# Altium schematic symbol library jlcpcb_2025_04_capacitors_extended_0603.schlib: 3668 symbols (part 4 of 20) (continued)
## 0603N150G101CT
designator C?  Capacitance: 15pF  (hidden comment: *)
Capacitor, Ceramic (MLCC), 15pF, ±2%, 100V, NP0, ±2%, SMD 0603; Manufacturer: Walsin Tech Corp; Manufacturer Part Number: 0603N150G101CT; Package Size: 0603; JLCPCB Basic Part: No; JLCPCB Part Number: C302055; Supplier 1: LCSC; Category: Capacitors - MLCC; Supplier Part Number 1: C302055; Tolerance: ±2%; Voltage Rating: 100V; Temperature Coefficient: NP0; RoHS: Yes; ComponentLink1Description: Datasheet; ComponentLink1URL: https://wmsc.lcsc.com/wmsc/upload/file/pdf/v2/lcsc/2304140030_Walsin-Tech-Corp-0603N150G101CT_C302055.pdf; ComponentLink2Description: JLCPCB Part URL; ComponentLink2URL: https://jlcpcb.com/partdetail/C302055; ComponentLink3Description: LCSC Part URL; ComponentLink3URL: https://lcsc.com/product-detail/Multilayer-Ceramic-Capacitors-MLCC---SMD-SMT_Walsin-Tech-Corp-Walsin-Tech-Corp-0603N150G101CT_C302055.html
footprint CAP-0603 (0603 (1608M) Capacitor)
pins: 1, 2

## 0603N150G500CT
designator C?  Capacitance: 15pF  (hidden comment: *)
Capacitor, Ceramic (MLCC), 15pF, ±2%, 50V, NP0, ±2%, SMD 0603; Manufacturer: Walsin Tech Corp; Manufacturer Part Number: 0603N150G500CT; Package Size: 0603; JLCPCB Basic Part: No; JLCPCB Part Number: C388032; Supplier 1: LCSC; Category: Capacitors - MLCC; Supplier Part Number 1: C388032; Tolerance: ±2%; Voltage Rating: 50V; Temperature Coefficient: NP0; RoHS: Yes; ComponentLink1Description: Datasheet; ComponentLink1URL: https://wmsc.lcsc.com/wmsc/upload/file/pdf/v2/lcsc/2304140030_Walsin-Tech-Corp-0603N150G500CT_C388032.pdf; ComponentLink2Description: JLCPCB Part URL; ComponentLink2URL: https://jlcpcb.com/partdetail/C388032; ComponentLink3Description: LCSC Part URL; ComponentLink3URL: https://lcsc.com/product-detail/Multilayer-Ceramic-Capacitors-MLCC---SMD-SMT_Walsin-Tech-Corp-Walsin-Tech-Corp-0603N150G500CT_C388032.html
footprint CAP-0603 (0603 (1608M) Capacitor)
pins: 1, 2

## 0603N150J500CT
designator C?  Capacitance: 15pF  (hidden comment: *)
Capacitor, Ceramic (MLCC), 15pF, ±5%, 50V, NP0, ±5%, SMD 0603; Manufacturer: Walsin Tech Corp; Manufacturer Part Number: 0603N150J500CT; Package Size: 0603; JLCPCB Basic Part: No; JLCPCB Part Number: C302056; Supplier 1: LCSC; Category: Capacitors - MLCC; Supplier Part Number 1: C302056; Tolerance: ±5%; Voltage Rating: 50V; Temperature Coefficient: NP0; RoHS: Yes; ComponentLink1Description: Datasheet; ComponentLink1URL: https://wmsc.lcsc.com/wmsc/upload/file/pdf/v2/lcsc/2304140030_Walsin-Tech-Corp-0603N150J500CT_C302056.pdf; ComponentLink2Description: JLCPCB Part URL; ComponentLink2URL: https://jlcpcb.com/partdetail/C302056; ComponentLink3Description: LCSC Part URL; ComponentLink3URL: https://lcsc.com/product-detail/Multilayer-Ceramic-Capacitors-MLCC---SMD-SMT_Walsin-Tech-Corp-Walsin-Tech-Corp-0603N150J500CT_C302056.html
footprint CAP-0603 (0603 (1608M) Capacitor)
pins: 1, 2

## 0603N150K500CT
designator C?  Capacitance: 15pF  (hidden comment: *)
Capacitor, Ceramic (MLCC), 15pF, ±10%, 50V, NP0, ±10%, SMD 0603; Manufacturer: Walsin Tech Corp; Manufacturer Part Number: 0603N150K500CT; Package Size: 0603; JLCPCB Basic Part: No; JLCPCB Part Number: C384776; Supplier 1: LCSC; Category: Capacitors - MLCC; Supplier Part Number 1: C384776; Tolerance: ±10%; Voltage Rating: 50V; Temperature Coefficient: NP0; RoHS: Yes; ComponentLink1Description: Datasheet; ComponentLink1URL: https://wmsc.lcsc.com/wmsc/upload/file/pdf/v2/lcsc/2304140030_Walsin-Tech-Corp-0603N150K500CT_C384776.pdf; ComponentLink2Description: JLCPCB Part URL; ComponentLink2URL: https://jlcpcb.com/partdetail/C384776; ComponentLink3Description: LCSC Part URL; ComponentLink3URL: https://lcsc.com/product-detail/Multilayer-Ceramic-Capacitors-MLCC---SMD-SMT_Walsin-Tech-Corp-Walsin-Tech-Corp-0603N150K500CT_C384776.html
footprint CAP-0603 (0603 (1608M) Capacitor)
pins: 1, 2

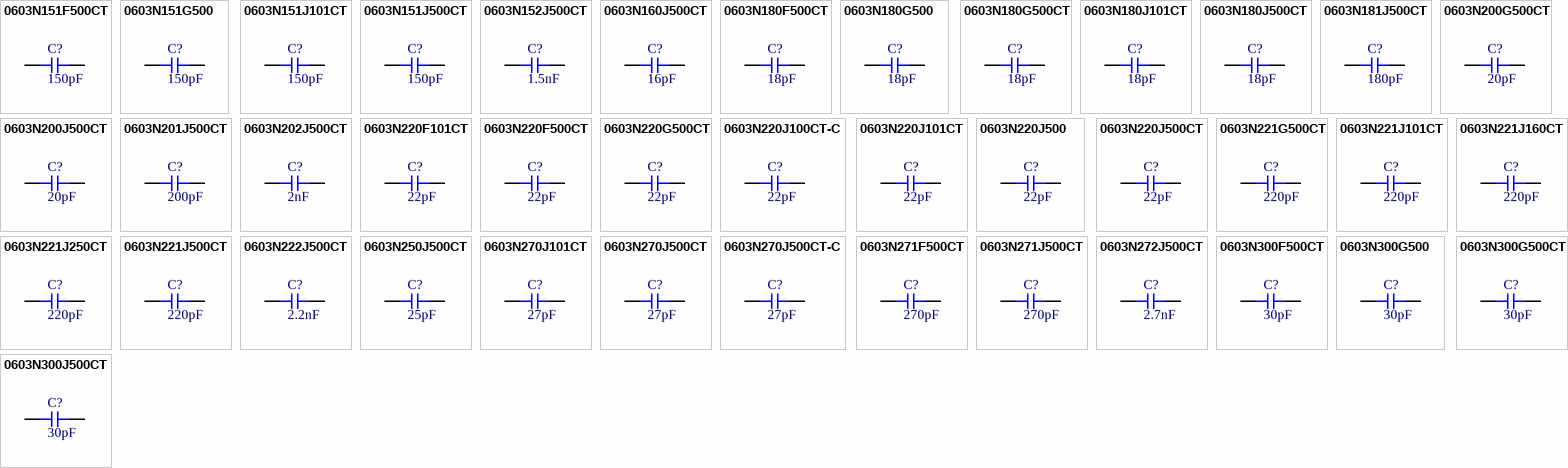
[diagram p17: symbols 0603N151F500CT to 0603N300J500CT]

## 0603N151F500CT
designator C?  Capacitance: 150pF  (hidden comment: *)
Capacitor, Ceramic (MLCC), 150pF, ±1%, 50V, NP0, ±1%, SMD 0603; Manufacturer: Walsin Tech Corp; Manufacturer Part Number: 0603N151F500CT; Package Size: 0603; JLCPCB Basic Part: No; JLCPCB Part Number: C458894; Supplier 1: LCSC; Category: Capacitors - MLCC; Supplier Part Number 1: C458894; Tolerance: ±1%; Voltage Rating: 50V; Temperature Coefficient: NP0; RoHS: Yes; ComponentLink1Description: Datasheet; ComponentLink1URL: https://wmsc.lcsc.com/wmsc/upload/file/pdf/v2/lcsc/2304140030_Walsin-Tech-Corp-0603N151F500CT_C458894.pdf; ComponentLink2Description: JLCPCB Part URL; ComponentLink2URL: https://jlcpcb.com/partdetail/C458894; ComponentLink3Description: LCSC Part URL; ComponentLink3URL: https://lcsc.com/product-detail/Multilayer-Ceramic-Capacitors-MLCC---SMD-SMT_Walsin-Tech-Corp-Walsin-Tech-Corp-0603N151F500CT_C458894.html
footprint CAP-0603 (0603 (1608M) Capacitor)
pins: 1, 2

## 0603N151G500
designator C?  Capacitance: 150pF  (hidden comment: *)
Capacitor, Ceramic (MLCC), 150pF, ±2%, 50V, NP0, ±2%, SMD 0603; Manufacturer: Walsin Tech Corp; Manufacturer Part Number: 0603N151G500; Package Size: 0603; JLCPCB Basic Part: No; JLCPCB Part Number: C152924; Supplier 1: LCSC; Category: Capacitors - MLCC; Supplier Part Number 1: C152924; Tolerance: ±2%; Voltage Rating: 50V; Temperature Coefficient: NP0; RoHS: Yes; ComponentLink1Description: Datasheet; ComponentLink1URL: https://wmsc.lcsc.com/wmsc/upload/file/pdf/v2/lcsc/2304140030_Walsin-Tech-Corp-0603N151G500_C152924.pdf; ComponentLink2Description: JLCPCB Part URL; ComponentLink2URL: https://jlcpcb.com/partdetail/C152924; ComponentLink3Description: LCSC Part URL; ComponentLink3URL: https://lcsc.com/product-detail/Multilayer-Ceramic-Capacitors-MLCC---SMD-SMT_Walsin-Tech-Corp-Walsin-Tech-Corp-0603N151G500_C152924.html
footprint CAP-0603 (0603 (1608M) Capacitor)
pins: 1, 2

## 0603N151J101CT
designator C?  Capacitance: 150pF  (hidden comment: *)
Capacitor, Ceramic (MLCC), 150pF, ±5%, 100V, NP0, ±5%, SMD 0603; Manufacturer: Walsin Tech Corp; Manufacturer Part Number: 0603N151J101CT; Package Size: 0603; JLCPCB Basic Part: No; JLCPCB Part Number: C388033; Supplier 1: LCSC; Category: Capacitors - MLCC; Supplier Part Number 1: C388033; Tolerance: ±5%; Voltage Rating: 100V; Temperature Coefficient: NP0; RoHS: Yes; ComponentLink1Description: Datasheet; ComponentLink1URL: https://wmsc.lcsc.com/wmsc/upload/file/pdf/v2/lcsc/2304140030_Walsin-Tech-Corp-0603N151J101CT_C388033.pdf; ComponentLink2Description: JLCPCB Part URL; ComponentLink2URL: https://jlcpcb.com/partdetail/C388033; ComponentLink3Description: LCSC Part URL; ComponentLink3URL: https://lcsc.com/product-detail/Multilayer-Ceramic-Capacitors-MLCC---SMD-SMT_Walsin-Tech-Corp-Walsin-Tech-Corp-0603N151J101CT_C388033.html
footprint CAP-0603 (0603 (1608M) Capacitor)
pins: 1, 2

## 0603N151J500CT
designator C?  Capacitance: 150pF  (hidden comment: *)
Capacitor, Ceramic (MLCC), 150pF, ±5%, 50V, NP0, ±5%, SMD 0603; Manufacturer: Walsin Tech Corp; Manufacturer Part Number: 0603N151J500CT; Package Size: 0603; JLCPCB Basic Part: No; JLCPCB Part Number: C168906; Supplier 1: LCSC; Category: Capacitors - MLCC; Supplier Part Number 1: C168906; Tolerance: ±5%; Voltage Rating: 50V; Temperature Coefficient: NP0; RoHS: Yes; ComponentLink1Description: Datasheet; ComponentLink1URL: https://wmsc.lcsc.com/wmsc/upload/file/pdf/v2/lcsc/2304140030_Walsin-Tech-Corp-0603N151J500CT_C168906.pdf; ComponentLink2Description: JLCPCB Part URL; ComponentLink2URL: https://jlcpcb.com/partdetail/C168906; ComponentLink3Description: LCSC Part URL; ComponentLink3URL: https://lcsc.com/product-detail/Multilayer-Ceramic-Capacitors-MLCC---SMD-SMT_Walsin-Tech-Corp-Walsin-Tech-Corp-0603N151J500CT_C168906.html
footprint CAP-0603 (0603 (1608M) Capacitor)
pins: 1, 2

## 0603N152J500CT
designator C?  Capacitance: 1.5nF  (hidden comment: *)
Capacitor, Ceramic (MLCC), 1.5nF, ±5%, 50V, NP0, ±5%, SMD 0603; Manufacturer: Walsin Tech Corp; Manufacturer Part Number: 0603N152J500CT; Package Size: 0603; JLCPCB Basic Part: No; JLCPCB Part Number: C424864; Supplier 1: LCSC; Category: Capacitors - MLCC; Supplier Part Number 1: C424864; Tolerance: ±5%; Voltage Rating: 50V; Temperature Coefficient: NP0; RoHS: Yes; ComponentLink1Description: Datasheet; ComponentLink1URL: https://wmsc.lcsc.com/wmsc/upload/file/pdf/v2/lcsc/2304140030_Walsin-Tech-Corp-0603N152J500CT_C424864.pdf; ComponentLink2Description: JLCPCB Part URL; ComponentLink2URL: https://jlcpcb.com/partdetail/C424864; ComponentLink3Description: LCSC Part URL; ComponentLink3URL: https://lcsc.com/product-detail/Multilayer-Ceramic-Capacitors-MLCC---SMD-SMT_Walsin-Tech-Corp-Walsin-Tech-Corp-0603N152J500CT_C424864.html
footprint CAP-0603 (0603 (1608M) Capacitor)
pins: 1, 2

## 0603N160J500CT
designator C?  Capacitance: 16pF  (hidden comment: *)
Capacitor, Ceramic (MLCC), 16pF, ±5%, 50V, NP0, ±5%, SMD 0603; Manufacturer: Walsin Tech Corp; Manufacturer Part Number: 0603N160J500CT; Package Size: 0603; JLCPCB Basic Part: No; JLCPCB Part Number: C152922; Supplier 1: LCSC; Category: Capacitors - MLCC; Supplier Part Number 1: C152922; Tolerance: ±5%; Voltage Rating: 50V; Temperature Coefficient: NP0; RoHS: Yes; ComponentLink1Description: Datasheet; ComponentLink1URL: https://wmsc.lcsc.com/wmsc/upload/file/pdf/v2/lcsc/2304140030_Walsin-Tech-Corp-0603N160J500CT_C152922.pdf; ComponentLink2Description: JLCPCB Part URL; ComponentLink2URL: https://jlcpcb.com/partdetail/C152922; ComponentLink3Description: LCSC Part URL; ComponentLink3URL: https://lcsc.com/product-detail/Multilayer-Ceramic-Capacitors-MLCC---SMD-SMT_Walsin-Tech-Corp-Walsin-Tech-Corp-0603N160J500CT_C152922.html
footprint CAP-0603 (0603 (1608M) Capacitor)
pins: 1, 2

## 0603N180F500CT
designator C?  Capacitance: 18pF  (hidden comment: *)
Capacitor, Ceramic (MLCC), 18pF, ±1%, 50V, NP0, ±1%, SMD 0603; Manufacturer: Walsin Tech Corp; Manufacturer Part Number: 0603N180F500CT; Package Size: 0603; JLCPCB Basic Part: No; JLCPCB Part Number: C509264; Supplier 1: LCSC; Category: Capacitors - MLCC; Supplier Part Number 1: C509264; Tolerance: ±1%; Voltage Rating: 50V; Temperature Coefficient: NP0; RoHS: Yes; ComponentLink1Description: Datasheet; ComponentLink1URL: https://wmsc.lcsc.com/wmsc/upload/file/pdf/v2/lcsc/2304140030_Walsin-Tech-Corp-0603N180F500CT_C509264.pdf; ComponentLink2Description: JLCPCB Part URL; ComponentLink2URL: https://jlcpcb.com/partdetail/C509264; ComponentLink3Description: LCSC Part URL; ComponentLink3URL: https://lcsc.com/product-detail/Multilayer-Ceramic-Capacitors-MLCC---SMD-SMT_Walsin-Tech-Corp-Walsin-Tech-Corp-0603N180F500CT_C509264.html
footprint CAP-0603 (0603 (1608M) Capacitor)
pins: 1, 2

## 0603N180G500
designator C?  Capacitance: 18pF  (hidden comment: *)
Capacitor, Ceramic (MLCC), 18pF, ±2%, 50V, NP0, ±2%, SMD 0603; Manufacturer: Walsin Tech Corp; Manufacturer Part Number: 0603N180G500; Package Size: 0603; JLCPCB Basic Part: No; JLCPCB Part Number: C152921; Supplier 1: LCSC; Category: Capacitors - MLCC; Supplier Part Number 1: C152921; Tolerance: ±2%; Voltage Rating: 50V; Temperature Coefficient: NP0; RoHS: Yes; ComponentLink1Description: Datasheet; ComponentLink1URL: https://wmsc.lcsc.com/wmsc/upload/file/pdf/v2/lcsc/2304140030_Walsin-Tech-Corp-0603N180G500_C152921.pdf; ComponentLink2Description: JLCPCB Part URL; ComponentLink2URL: https://jlcpcb.com/partdetail/C152921; ComponentLink3Description: LCSC Part URL; ComponentLink3URL: https://lcsc.com/product-detail/Multilayer-Ceramic-Capacitors-MLCC---SMD-SMT_Walsin-Tech-Corp-Walsin-Tech-Corp-0603N180G500_C152921.html
footprint CAP-0603 (0603 (1608M) Capacitor)
pins: 1, 2

## 0603N180G500CT
designator C?  Capacitance: 18pF  (hidden comment: *)
Capacitor, Ceramic (MLCC), 18pF, ±2%, 50V, NP0, ±2%, SMD 0603; Manufacturer: Walsin Tech Corp; Manufacturer Part Number: 0603N180G500CT; Package Size: 0603; JLCPCB Basic Part: No; JLCPCB Part Number: C2962049; Supplier 1: LCSC; Category: Capacitors - MLCC; Supplier Part Number 1: C2962049; Tolerance: ±2%; Voltage Rating: 50V; Temperature Coefficient: NP0; RoHS: Yes; ComponentLink1Description: Datasheet; ComponentLink1URL: https://wmsc.lcsc.com/wmsc/upload/file/pdf/v2/lcsc/2201181800_Walsin-Tech-Corp-0603N180G500CT_C2962049.pdf; ComponentLink2Description: JLCPCB Part URL; ComponentLink2URL: https://jlcpcb.com/partdetail/C2962049; ComponentLink3Description: LCSC Part URL; ComponentLink3URL: https://lcsc.com/product-detail/Multilayer-Ceramic-Capacitors-MLCC---SMD-SMT_Walsin-Tech-Corp-Walsin-Tech-Corp-0603N180G500CT_C2962049.html
footprint CAP-0603 (0603 (1608M) Capacitor)
pins: 1, 2

## 0603N180J101CT
designator C?  Capacitance: 18pF  (hidden comment: *)
Capacitor, Ceramic (MLCC), 18pF, ±5%, 100V, NP0, ±5%, SMD 0603; Manufacturer: Walsin Tech Corp; Manufacturer Part Number: 0603N180J101CT; Package Size: 0603; JLCPCB Basic Part: No; JLCPCB Part Number: C152920; Supplier 1: LCSC; Category: Capacitors - MLCC; Supplier Part Number 1: C152920; Tolerance: ±5%; Voltage Rating: 100V; Temperature Coefficient: NP0; RoHS: Yes; ComponentLink1Description: Datasheet; ComponentLink1URL: https://wmsc.lcsc.com/wmsc/upload/file/pdf/v2/lcsc/2304140030_Walsin-Tech-Corp-0603N180J101CT_C152920.pdf; ComponentLink2Description: JLCPCB Part URL; ComponentLink2URL: https://jlcpcb.com/partdetail/C152920; ComponentLink3Description: LCSC Part URL; ComponentLink3URL: https://lcsc.com/product-detail/Multilayer-Ceramic-Capacitors-MLCC---SMD-SMT_Walsin-Tech-Corp-Walsin-Tech-Corp-0603N180J101CT_C152920.html
footprint CAP-0603 (0603 (1608M) Capacitor)
pins: 1, 2

## 0603N180J500CT
designator C?  Capacitance: 18pF  (hidden comment: *)
Capacitor, Ceramic (MLCC), 18pF, ±5%, 50V, NP0, ±5%, SMD 0603; Manufacturer: Walsin Tech Corp; Manufacturer Part Number: 0603N180J500CT; Package Size: 0603; JLCPCB Basic Part: No; JLCPCB Part Number: C123538; Supplier 1: LCSC; Category: Capacitors - MLCC; Supplier Part Number 1: C123538; Tolerance: ±5%; Voltage Rating: 50V; Temperature Coefficient: NP0; RoHS: Yes; ComponentLink1Description: Datasheet; ComponentLink1URL: https://wmsc.lcsc.com/wmsc/upload/file/pdf/v2/lcsc/2304140030_Walsin-Tech-Corp-0603N180J500CT_C123538.pdf; ComponentLink2Description: JLCPCB Part URL; ComponentLink2URL: https://jlcpcb.com/partdetail/C123538; ComponentLink3Description: LCSC Part URL; ComponentLink3URL: https://lcsc.com/product-detail/Multilayer-Ceramic-Capacitors-MLCC---SMD-SMT_Walsin-Tech-Corp-Walsin-Tech-Corp-0603N180J500CT_C123538.html
footprint CAP-0603 (0603 (1608M) Capacitor)
pins: 1, 2

## 0603N181J500CT
designator C?  Capacitance: 180pF  (hidden comment: *)
Capacitor, Ceramic (MLCC), 180pF, ±5%, 50V, NP0, ±5%, SMD 0603; Manufacturer: Walsin Tech Corp; Manufacturer Part Number: 0603N181J500CT; Package Size: 0603; JLCPCB Basic Part: No; JLCPCB Part Number: C296050; Supplier 1: LCSC; Category: Capacitors - MLCC; Supplier Part Number 1: C296050; Tolerance: ±5%; Voltage Rating: 50V; Temperature Coefficient: NP0; RoHS: Yes; ComponentLink1Description: Datasheet; ComponentLink1URL: https://wmsc.lcsc.com/wmsc/upload/file/pdf/v2/lcsc/2304140030_Walsin-Tech-Corp-0603N181J500CT_C296050.pdf; ComponentLink2Description: JLCPCB Part URL; ComponentLink2URL: https://jlcpcb.com/partdetail/C296050; ComponentLink3Description: LCSC Part URL; ComponentLink3URL: https://lcsc.com/product-detail/Multilayer-Ceramic-Capacitors-MLCC---SMD-SMT_Walsin-Tech-Corp-Walsin-Tech-Corp-0603N181J500CT_C296050.html
footprint CAP-0603 (0603 (1608M) Capacitor)
pins: 1, 2

## 0603N200G500CT
designator C?  Capacitance: 20pF  (hidden comment: *)
Capacitor, Ceramic (MLCC), 20pF, ±2%, 50V, NP0, ±2%, SMD 0603; Manufacturer: Walsin Tech Corp; Manufacturer Part Number: 0603N200G500CT; Package Size: 0603; JLCPCB Basic Part: No; JLCPCB Part Number: C237187; Supplier 1: LCSC; Category: Capacitors - MLCC; Supplier Part Number 1: C237187; Tolerance: ±2%; Voltage Rating: 50V; Temperature Coefficient: NP0; RoHS: Yes; ComponentLink1Description: Datasheet; ComponentLink1URL: https://wmsc.lcsc.com/wmsc/upload/file/pdf/v2/lcsc/2304140030_Walsin-Tech-Corp-0603N200G500CT_C237187.pdf; ComponentLink2Description: JLCPCB Part URL; ComponentLink2URL: https://jlcpcb.com/partdetail/C237187; ComponentLink3Description: LCSC Part URL; ComponentLink3URL: https://lcsc.com/product-detail/Multilayer-Ceramic-Capacitors-MLCC---SMD-SMT_Walsin-Tech-Corp-Walsin-Tech-Corp-0603N200G500CT_C237187.html
footprint CAP-0603 (0603 (1608M) Capacitor)
pins: 1, 2

## 0603N200J500CT
designator C?  Capacitance: 20pF  (hidden comment: *)
Capacitor, Ceramic (MLCC), 20pF, ±5%, 50V, NP0, ±5%, SMD 0603; Manufacturer: Walsin Tech Corp; Manufacturer Part Number: 0603N200J500CT; Package Size: 0603; JLCPCB Basic Part: No; JLCPCB Part Number: C123543; Supplier 1: LCSC; Category: Capacitors - MLCC; Supplier Part Number 1: C123543; Tolerance: ±5%; Voltage Rating: 50V; Temperature Coefficient: NP0; RoHS: Yes; ComponentLink1Description: Datasheet; ComponentLink1URL: https://wmsc.lcsc.com/wmsc/upload/file/pdf/v2/lcsc/2304140030_Walsin-Tech-Corp-0603N200J500CT_C123543.pdf; ComponentLink2Description: JLCPCB Part URL; ComponentLink2URL: https://jlcpcb.com/partdetail/C123543; ComponentLink3Description: LCSC Part URL; ComponentLink3URL: https://lcsc.com/product-detail/Multilayer-Ceramic-Capacitors-MLCC---SMD-SMT_Walsin-Tech-Corp-Walsin-Tech-Corp-0603N200J500CT_C123543.html
footprint CAP-0603 (0603 (1608M) Capacitor)
pins: 1, 2

## 0603N201J500CT
designator C?  Capacitance: 200pF  (hidden comment: *)
Capacitor, Ceramic (MLCC), 200pF, ±5%, 50V, NP0, ±5%, SMD 0603; Manufacturer: Walsin Tech Corp; Manufacturer Part Number: 0603N201J500CT; Package Size: 0603; JLCPCB Basic Part: No; JLCPCB Part Number: C458897; Supplier 1: LCSC; Category: Capacitors - MLCC; Supplier Part Number 1: C458897; Tolerance: ±5%; Voltage Rating: 50V; Temperature Coefficient: NP0; RoHS: Yes; ComponentLink1Description: Datasheet; ComponentLink1URL: https://wmsc.lcsc.com/wmsc/upload/file/pdf/v2/lcsc/2304140030_Walsin-Tech-Corp-0603N201J500CT_C458897.pdf; ComponentLink2Description: JLCPCB Part URL; ComponentLink2URL: https://jlcpcb.com/partdetail/C458897; ComponentLink3Description: LCSC Part URL; ComponentLink3URL: https://lcsc.com/product-detail/Multilayer-Ceramic-Capacitors-MLCC---SMD-SMT_Walsin-Tech-Corp-Walsin-Tech-Corp-0603N201J500CT_C458897.html
footprint CAP-0603 (0603 (1608M) Capacitor)
pins: 1, 2

## 0603N202J500CT
designator C?  Capacitance: 2nF  (hidden comment: *)
Capacitor, Ceramic (MLCC), 2nF, ±5%, 50V, NP0, ±5%, SMD 0603; Manufacturer: Walsin Tech Corp; Manufacturer Part Number: 0603N202J500CT; Package Size: 0603; JLCPCB Basic Part: No; JLCPCB Part Number: C458898; Supplier 1: LCSC; Category: Capacitors - MLCC; Supplier Part Number 1: C458898; Tolerance: ±5%; Voltage Rating: 50V; Temperature Coefficient: NP0; RoHS: Yes; ComponentLink1Description: Datasheet; ComponentLink1URL: https://wmsc.lcsc.com/wmsc/upload/file/pdf/v2/lcsc/2304140030_Walsin-Tech-Corp-0603N202J500CT_C458898.pdf; ComponentLink2Description: JLCPCB Part URL; ComponentLink2URL: https://jlcpcb.com/partdetail/C458898; ComponentLink3Description: LCSC Part URL; ComponentLink3URL: https://lcsc.com/product-detail/Multilayer-Ceramic-Capacitors-MLCC---SMD-SMT_Walsin-Tech-Corp-Walsin-Tech-Corp-0603N202J500CT_C458898.html
footprint CAP-0603 (0603 (1608M) Capacitor)
pins: 1, 2

## 0603N220F101CT
designator C?  Capacitance: 22pF  (hidden comment: *)
Capacitor, Ceramic (MLCC), 22pF, ±1%, 100V, NP0, ±1%, SMD 0603; Manufacturer: Walsin Tech Corp; Manufacturer Part Number: 0603N220F101CT; Package Size: 0603; JLCPCB Basic Part: No; JLCPCB Part Number: C296053; Supplier 1: LCSC; Category: Capacitors - MLCC; Supplier Part Number 1: C296053; Tolerance: ±1%; Voltage Rating: 100V; Temperature Coefficient: NP0; RoHS: Yes; ComponentLink1Description: Datasheet; ComponentLink1URL: https://wmsc.lcsc.com/wmsc/upload/file/pdf/v2/lcsc/2304140030_Walsin-Tech-Corp-0603N220F101CT_C296053.pdf; ComponentLink2Description: JLCPCB Part URL; ComponentLink2URL: https://jlcpcb.com/partdetail/C296053; ComponentLink3Description: LCSC Part URL; ComponentLink3URL: https://lcsc.com/product-detail/Multilayer-Ceramic-Capacitors-MLCC---SMD-SMT_Walsin-Tech-Corp-Walsin-Tech-Corp-0603N220F101CT_C296053.html
footprint CAP-0603 (0603 (1608M) Capacitor)
pins: 1, 2

## 0603N220F500CT
designator C?  Capacitance: 22pF  (hidden comment: *)
Capacitor, Ceramic (MLCC), 22pF, ±1%, 50V, NP0, ±1%, SMD 0603; Manufacturer: Walsin Tech Corp; Manufacturer Part Number: 0603N220F500CT; Package Size: 0603; JLCPCB Basic Part: No; JLCPCB Part Number: C388038; Supplier 1: LCSC; Category: Capacitors - MLCC; Supplier Part Number 1: C388038; Tolerance: ±1%; Voltage Rating: 50V; Temperature Coefficient: NP0; RoHS: Yes; ComponentLink1Description: Datasheet; ComponentLink1URL: https://wmsc.lcsc.com/wmsc/upload/file/pdf/v2/lcsc/2304140030_Walsin-Tech-Corp-0603N220F500CT_C388038.pdf; ComponentLink2Description: JLCPCB Part URL; ComponentLink2URL: https://jlcpcb.com/partdetail/C388038; ComponentLink3Description: LCSC Part URL; ComponentLink3URL: https://lcsc.com/product-detail/Multilayer-Ceramic-Capacitors-MLCC---SMD-SMT_Walsin-Tech-Corp-Walsin-Tech-Corp-0603N220F500CT_C388038.html
footprint CAP-0603 (0603 (1608M) Capacitor)
pins: 1, 2

## 0603N220G500CT
designator C?  Capacitance: 22pF  (hidden comment: *)
Capacitor, Ceramic (MLCC), 22pF, ±2%, 50V, NP0, ±2%, SMD 0603; Manufacturer: Walsin Tech Corp; Manufacturer Part Number: 0603N220G500CT; Package Size: 0603; JLCPCB Basic Part: No; JLCPCB Part Number: C388039; Supplier 1: LCSC; Category: Capacitors - MLCC; Supplier Part Number 1: C388039; Tolerance: ±2%; Voltage Rating: 50V; Temperature Coefficient: NP0; RoHS: Yes; ComponentLink1Description: Datasheet; ComponentLink1URL: https://wmsc.lcsc.com/wmsc/upload/file/pdf/v2/lcsc/2304140030_Walsin-Tech-Corp-0603N220G500CT_C388039.pdf; ComponentLink2Description: JLCPCB Part URL; ComponentLink2URL: https://jlcpcb.com/partdetail/C388039; ComponentLink3Description: LCSC Part URL; ComponentLink3URL: https://lcsc.com/product-detail/Multilayer-Ceramic-Capacitors-MLCC---SMD-SMT_Walsin-Tech-Corp-Walsin-Tech-Corp-0603N220G500CT_C388039.html
footprint CAP-0603 (0603 (1608M) Capacitor)
pins: 1, 2

## 0603N220J100CT-C
designator C?  Capacitance: 22pF  (hidden comment: *)
Capacitor, Ceramic (MLCC), 22pF, ±5%, 10V, NP0, ±5%, SMD 0603; Manufacturer: Walsin Tech Corp; Manufacturer Part Number: 0603N220J100CT-C; Package Size: 0603; JLCPCB Basic Part: No; JLCPCB Part Number: C2991405; Supplier 1: LCSC; Category: Capacitors - MLCC; Supplier Part Number 1: C2991405; Tolerance: ±5%; Voltage Rating: 10V; Temperature Coefficient: NP0; RoHS: Yes; ComponentLink1Description: Datasheet; ComponentLink1URL: https://wmsc.lcsc.com/wmsc/upload/file/pdf/v2/lcsc/2204131745_Walsin-Tech-Corp-0603N220J100CT-C_C2991405.pdf; ComponentLink2Description: JLCPCB Part URL; ComponentLink2URL: https://jlcpcb.com/partdetail/C2991405; ComponentLink3Description: LCSC Part URL; ComponentLink3URL: https://lcsc.com/product-detail/Multilayer-Ceramic-Capacitors-MLCC---SMD-SMT_Walsin-Tech-Corp-Walsin-Tech-Corp-0603N220J100CT-C_C2991405.html
footprint CAP-0603 (0603 (1608M) Capacitor)
pins: 1, 2

## 0603N220J101CT
designator C?  Capacitance: 22pF  (hidden comment: *)
Capacitor, Ceramic (MLCC), 22pF, ±5%, 100V, NP0, ±5%, SMD 0603; Manufacturer: Walsin Tech Corp; Manufacturer Part Number: 0603N220J101CT; Package Size: 0603; JLCPCB Basic Part: No; JLCPCB Part Number: C388040; Supplier 1: LCSC; Category: Capacitors - MLCC; Supplier Part Number 1: C388040; Tolerance: ±5%; Voltage Rating: 100V; Temperature Coefficient: NP0; RoHS: Yes; ComponentLink1Description: Datasheet; ComponentLink1URL: https://wmsc.lcsc.com/wmsc/upload/file/pdf/v2/lcsc/2304140030_Walsin-Tech-Corp-0603N220J101CT_C388040.pdf; ComponentLink2Description: JLCPCB Part URL; ComponentLink2URL: https://jlcpcb.com/partdetail/C388040; ComponentLink3Description: LCSC Part URL; ComponentLink3URL: https://lcsc.com/product-detail/Multilayer-Ceramic-Capacitors-MLCC---SMD-SMT_Walsin-Tech-Corp-Walsin-Tech-Corp-0603N220J101CT_C388040.html
footprint CAP-0603 (0603 (1608M) Capacitor)
pins: 1, 2

## 0603N220J500
designator C?  Capacitance: 22pF  (hidden comment: *)
Capacitor, Ceramic (MLCC), 22pF, ±5%, 50V, NP0, ±5%, SMD 0603; Manufacturer: Walsin Tech Corp; Manufacturer Part Number: 0603N220J500; Package Size: 0603; JLCPCB Basic Part: No; JLCPCB Part Number: C107451; Supplier 1: LCSC; Category: Capacitors - MLCC; Supplier Part Number 1: C107451; Tolerance: ±5%; Voltage Rating: 50V; Temperature Coefficient: NP0; RoHS: Yes; ComponentLink1Description: Datasheet; ComponentLink1URL: https://wmsc.lcsc.com/wmsc/upload/file/pdf/v2/lcsc/2304140030_Walsin-Tech-Corp-0603N220J500_C107451.pdf; ComponentLink2Description: JLCPCB Part URL; ComponentLink2URL: https://jlcpcb.com/partdetail/C107451; ComponentLink3Description: LCSC Part URL; ComponentLink3URL: https://lcsc.com/product-detail/Multilayer-Ceramic-Capacitors-MLCC---SMD-SMT_Walsin-Tech-Corp-Walsin-Tech-Corp-0603N220J500_C107451.html
footprint CAP-0603 (0603 (1608M) Capacitor)
pins: 1, 2

## 0603N220J500CT
designator C?  Capacitance: 22pF  (hidden comment: *)
Capacitor, Ceramic (MLCC), 22pF, 50V, NP0, SMD 0603; Manufacturer: Walsin Tech Corp; Manufacturer Part Number: 0603N220J500CT; Package Size: 0603; JLCPCB Basic Part: No; JLCPCB Part Number: C2875465; Supplier 1: LCSC; Category: Capacitors - MLCC; Supplier Part Number 1: C2875465; Voltage Rating: 50V; Temperature Coefficient: NP0; RoHS: Yes; ComponentLink1Description: Datasheet; ComponentLink1URL: https://wmsc.lcsc.com/wmsc/upload/file/pdf/v2/lcsc/2108241230_Walsin-Tech-Corp-0603N220J500CT_C2875465.pdf; ComponentLink2Description: JLCPCB Part URL; ComponentLink2URL: https://jlcpcb.com/partdetail/C2875465; ComponentLink3Description: LCSC Part URL; ComponentLink3URL: https://lcsc.com/product-detail/Multilayer-Ceramic-Capacitors-MLCC---SMD-SMT_Walsin-Tech-Corp-Walsin-Tech-Corp-0603N220J500CT_C2875465.html
footprint CAP-0603 (0603 (1608M) Capacitor)
pins: 1, 2

## 0603N221G500CT
designator C?  Capacitance: 220pF  (hidden comment: *)
Capacitor, Ceramic (MLCC), 220pF, ±2%, 50V, NP0, ±2%, SMD 0603; Manufacturer: Walsin Tech Corp; Manufacturer Part Number: 0603N221G500CT; Package Size: 0603; JLCPCB Basic Part: No; JLCPCB Part Number: C302060; Supplier 1: LCSC; Category: Capacitors - MLCC; Supplier Part Number 1: C302060; Tolerance: ±2%; Voltage Rating: 50V; Temperature Coefficient: NP0; RoHS: Yes; ComponentLink1Description: Datasheet; ComponentLink1URL: https://wmsc.lcsc.com/wmsc/upload/file/pdf/v2/lcsc/2304140030_Walsin-Tech-Corp-0603N221G500CT_C302060.pdf; ComponentLink2Description: JLCPCB Part URL; ComponentLink2URL: https://jlcpcb.com/partdetail/C302060; ComponentLink3Description: LCSC Part URL; ComponentLink3URL: https://lcsc.com/product-detail/Multilayer-Ceramic-Capacitors-MLCC---SMD-SMT_Walsin-Tech-Corp-Walsin-Tech-Corp-0603N221G500CT_C302060.html
footprint CAP-0603 (0603 (1608M) Capacitor)
pins: 1, 2

## 0603N221J101CT
designator C?  Capacitance: 220pF  (hidden comment: *)
Capacitor, Ceramic (MLCC), 220pF, ±5%, 100V, NP0, ±5%, SMD 0603; Manufacturer: Walsin Tech Corp; Manufacturer Part Number: 0603N221J101CT; Package Size: 0603; JLCPCB Basic Part: No; JLCPCB Part Number: C152914; Supplier 1: LCSC; Category: Capacitors - MLCC; Supplier Part Number 1: C152914; Tolerance: ±5%; Voltage Rating: 100V; Temperature Coefficient: NP0; RoHS: Yes; ComponentLink1Description: Datasheet; ComponentLink1URL: https://wmsc.lcsc.com/wmsc/upload/file/pdf/v2/lcsc/2304140030_Walsin-Tech-Corp-0603N221J101CT_C152914.pdf; ComponentLink2Description: JLCPCB Part URL; ComponentLink2URL: https://jlcpcb.com/partdetail/C152914; ComponentLink3Description: LCSC Part URL; ComponentLink3URL: https://lcsc.com/product-detail/Multilayer-Ceramic-Capacitors-MLCC---SMD-SMT_Walsin-Tech-Corp-Walsin-Tech-Corp-0603N221J101CT_C152914.html
footprint CAP-0603 (0603 (1608M) Capacitor)
pins: 1, 2

## 0603N221J160CT
designator C?  Capacitance: 220pF  (hidden comment: *)
Capacitor, Ceramic (MLCC), 220pF, ±5%, 16V, NP0, ±5%, SMD 0603; Manufacturer: Walsin Tech Corp; Manufacturer Part Number: 0603N221J160CT; Package Size: 0603; JLCPCB Basic Part: No; JLCPCB Part Number: C302061; Supplier 1: LCSC; Category: Capacitors - MLCC; Supplier Part Number 1: C302061; Tolerance: ±5%; Voltage Rating: 16V; Temperature Coefficient: NP0; RoHS: Yes; ComponentLink1Description: Datasheet; ComponentLink1URL: https://wmsc.lcsc.com/wmsc/upload/file/pdf/v2/lcsc/2304140030_Walsin-Tech-Corp-0603N221J160CT_C302061.pdf; ComponentLink2Description: JLCPCB Part URL; ComponentLink2URL: https://jlcpcb.com/partdetail/C302061; ComponentLink3Description: LCSC Part URL; ComponentLink3URL: https://lcsc.com/product-detail/Multilayer-Ceramic-Capacitors-MLCC---SMD-SMT_Walsin-Tech-Corp-Walsin-Tech-Corp-0603N221J160CT_C302061.html
footprint CAP-0603 (0603 (1608M) Capacitor)
pins: 1, 2

## 0603N221J250CT
designator C?  Capacitance: 220pF  (hidden comment: *)
Capacitor, Ceramic (MLCC), 220pF, ±5%, 25V, NP0, ±5%, SMD 0603; Manufacturer: Walsin Tech Corp; Manufacturer Part Number: 0603N221J250CT; Package Size: 0603; JLCPCB Basic Part: No; JLCPCB Part Number: C458899; Supplier 1: LCSC; Category: Capacitors - MLCC; Supplier Part Number 1: C458899; Tolerance: ±5%; Voltage Rating: 25V; Temperature Coefficient: NP0; RoHS: Yes; ComponentLink1Description: Datasheet; ComponentLink1URL: https://wmsc.lcsc.com/wmsc/upload/file/pdf/v2/lcsc/2304140030_Walsin-Tech-Corp-0603N221J250CT_C458899.pdf; ComponentLink2Description: JLCPCB Part URL; ComponentLink2URL: https://jlcpcb.com/partdetail/C458899; ComponentLink3Description: LCSC Part URL; ComponentLink3URL: https://lcsc.com/product-detail/Multilayer-Ceramic-Capacitors-MLCC---SMD-SMT_Walsin-Tech-Corp-Walsin-Tech-Corp-0603N221J250CT_C458899.html
footprint CAP-0603 (0603 (1608M) Capacitor)
pins: 1, 2

## 0603N221J500CT
designator C?  Capacitance: 220pF  (hidden comment: *)
Capacitor, Ceramic (MLCC), 220pF, ±5%, 50V, NP0, ±5%, SMD 0603; Manufacturer: Walsin Tech Corp; Manufacturer Part Number: 0603N221J500CT; Package Size: 0603; JLCPCB Basic Part: No; JLCPCB Part Number: C302062; Supplier 1: LCSC; Category: Capacitors - MLCC; Supplier Part Number 1: C302062; Tolerance: ±5%; Voltage Rating: 50V; Temperature Coefficient: NP0; RoHS: Yes; ComponentLink1Description: Datasheet; ComponentLink1URL: https://wmsc.lcsc.com/wmsc/upload/file/pdf/v2/lcsc/2304140030_Walsin-Tech-Corp-0603N221J500CT_C302062.pdf; ComponentLink2Description: JLCPCB Part URL; ComponentLink2URL: https://jlcpcb.com/partdetail/C302062; ComponentLink3Description: LCSC Part URL; ComponentLink3URL: https://lcsc.com/product-detail/Multilayer-Ceramic-Capacitors-MLCC---SMD-SMT_Walsin-Tech-Corp-Walsin-Tech-Corp-0603N221J500CT_C302062.html
footprint CAP-0603 (0603 (1608M) Capacitor)
pins: 1, 2

## 0603N222J500CT
designator C?  Capacitance: 2.2nF  (hidden comment: *)
Capacitor, Ceramic (MLCC), 2.2nF, ±5%, 50V, NP0, ±5%, SMD 0603; Manufacturer: Walsin Tech Corp; Manufacturer Part Number: 0603N222J500CT; Package Size: 0603; JLCPCB Basic Part: No; JLCPCB Part Number: C296055; Supplier 1: LCSC; Category: Capacitors - MLCC; Supplier Part Number 1: C296055; Tolerance: ±5%; Voltage Rating: 50V; Temperature Coefficient: NP0; RoHS: Yes; ComponentLink1Description: Datasheet; ComponentLink1URL: https://wmsc.lcsc.com/wmsc/upload/file/pdf/v2/lcsc/2304140030_Walsin-Tech-Corp-0603N222J500CT_C296055.pdf; ComponentLink2Description: JLCPCB Part URL; ComponentLink2URL: https://jlcpcb.com/partdetail/C296055; ComponentLink3Description: LCSC Part URL; ComponentLink3URL: https://lcsc.com/product-detail/Multilayer-Ceramic-Capacitors-MLCC---SMD-SMT_Walsin-Tech-Corp-Walsin-Tech-Corp-0603N222J500CT_C296055.html
footprint CAP-0603 (0603 (1608M) Capacitor)
pins: 1, 2

## 0603N250J500CT
designator C?  Capacitance: 25pF  (hidden comment: *)
Capacitor, Ceramic (MLCC), 25pF, ±5%, 50V, NP0, ±5%, SMD 0603; Manufacturer: Walsin Tech Corp; Manufacturer Part Number: 0603N250J500CT; Package Size: 0603; JLCPCB Basic Part: No; JLCPCB Part Number: C388042; Supplier 1: LCSC; Category: Capacitors - MLCC; Supplier Part Number 1: C388042; Tolerance: ±5%; Voltage Rating: 50V; Temperature Coefficient: NP0; RoHS: Yes; ComponentLink1Description: Datasheet; ComponentLink1URL: https://wmsc.lcsc.com/wmsc/upload/file/pdf/v2/lcsc/2304140030_Walsin-Tech-Corp-0603N250J500CT_C388042.pdf; ComponentLink2Description: JLCPCB Part URL; ComponentLink2URL: https://jlcpcb.com/partdetail/C388042; ComponentLink3Description: LCSC Part URL; ComponentLink3URL: https://lcsc.com/product-detail/Multilayer-Ceramic-Capacitors-MLCC---SMD-SMT_Walsin-Tech-Corp-Walsin-Tech-Corp-0603N250J500CT_C388042.html
footprint CAP-0603 (0603 (1608M) Capacitor)
pins: 1, 2

## 0603N270J101CT
designator C?  Capacitance: 27pF  (hidden comment: *)
Capacitor, Ceramic (MLCC), 27pF, ±5%, 100V, NP0, ±5%, SMD 0603; Manufacturer: Walsin Tech Corp; Manufacturer Part Number: 0603N270J101CT; Package Size: 0603; JLCPCB Basic Part: No; JLCPCB Part Number: C458900; Supplier 1: LCSC; Category: Capacitors - MLCC; Supplier Part Number 1: C458900; Tolerance: ±5%; Voltage Rating: 100V; Temperature Coefficient: NP0; RoHS: Yes; ComponentLink1Description: Datasheet; ComponentLink1URL: https://wmsc.lcsc.com/wmsc/upload/file/pdf/v2/lcsc/2304140030_Walsin-Tech-Corp-0603N270J101CT_C458900.pdf; ComponentLink2Description: JLCPCB Part URL; ComponentLink2URL: https://jlcpcb.com/partdetail/C458900; ComponentLink3Description: LCSC Part URL; ComponentLink3URL: https://lcsc.com/product-detail/Multilayer-Ceramic-Capacitors-MLCC---SMD-SMT_Walsin-Tech-Corp-Walsin-Tech-Corp-0603N270J101CT_C458900.html
footprint CAP-0603 (0603 (1608M) Capacitor)
pins: 1, 2

## 0603N270J500CT
designator C?  Capacitance: 27pF  (hidden comment: *)
Capacitor, Ceramic (MLCC), 27pF, ±5%, 50V, NP0, ±5%, SMD 0603; Manufacturer: Walsin Tech Corp; Manufacturer Part Number: 0603N270J500CT; Package Size: 0603; JLCPCB Basic Part: No; JLCPCB Part Number: C302064; Supplier 1: LCSC; Category: Capacitors - MLCC; Supplier Part Number 1: C302064; Tolerance: ±5%; Voltage Rating: 50V; Temperature Coefficient: NP0; RoHS: Yes; ComponentLink1Description: Datasheet; ComponentLink1URL: https://wmsc.lcsc.com/wmsc/upload/file/pdf/v2/lcsc/2304140030_Walsin-Tech-Corp-0603N270J500CT_C302064.pdf; ComponentLink2Description: JLCPCB Part URL; ComponentLink2URL: https://jlcpcb.com/partdetail/C302064; ComponentLink3Description: LCSC Part URL; ComponentLink3URL: https://lcsc.com/product-detail/Multilayer-Ceramic-Capacitors-MLCC---SMD-SMT_Walsin-Tech-Corp-Walsin-Tech-Corp-0603N270J500CT_C302064.html
footprint CAP-0603 (0603 (1608M) Capacitor)
pins: 1, 2

## 0603N270J500CT-C
designator C?  Capacitance: 27pF  (hidden comment: *)
Capacitor, Ceramic (MLCC), 27pF, 50V, NP0, SMD 0603; Manufacturer: Walsin Tech Corp; Manufacturer Part Number: 0603N270J500CT-C; Package Size: 0603; JLCPCB Basic Part: No; JLCPCB Part Number: C2991416; Supplier 1: LCSC; Category: Capacitors - MLCC; Supplier Part Number 1: C2991416; Voltage Rating: 50V; Temperature Coefficient: NP0; RoHS: Yes; ComponentLink1Description: Datasheet; ComponentLink1URL: https://wmsc.lcsc.com/wmsc/upload/file/pdf/v2/lcsc/2204131745_Walsin-Tech-Corp-0603N270J500CT-C_C2991416.pdf; ComponentLink2Description: JLCPCB Part URL; ComponentLink2URL: https://jlcpcb.com/partdetail/C2991416; ComponentLink3Description: LCSC Part URL; ComponentLink3URL: https://lcsc.com/product-detail/Multilayer-Ceramic-Capacitors-MLCC---SMD-SMT_Walsin-Tech-Corp-Walsin-Tech-Corp-0603N270J500CT-C_C2991416.html
footprint CAP-0603 (0603 (1608M) Capacitor)
pins: 1, 2

## 0603N271F500CT
designator C?  Capacitance: 270pF  (hidden comment: *)
Capacitor, Ceramic (MLCC), 270pF, ±1%, 50V, NP0, ±1%, SMD 0603; Manufacturer: Walsin Tech Corp; Manufacturer Part Number: 0603N271F500CT; Package Size: 0603; JLCPCB Basic Part: No; JLCPCB Part Number: C296058; Supplier 1: LCSC; Category: Capacitors - MLCC; Supplier Part Number 1: C296058; Tolerance: ±1%; Voltage Rating: 50V; Temperature Coefficient: NP0; RoHS: Yes; ComponentLink1Description: Datasheet; ComponentLink1URL: https://wmsc.lcsc.com/wmsc/upload/file/pdf/v2/lcsc/2304140030_Walsin-Tech-Corp-0603N271F500CT_C296058.pdf; ComponentLink2Description: JLCPCB Part URL; ComponentLink2URL: https://jlcpcb.com/partdetail/C296058; ComponentLink3Description: LCSC Part URL; ComponentLink3URL: https://lcsc.com/product-detail/Multilayer-Ceramic-Capacitors-MLCC---SMD-SMT_Walsin-Tech-Corp-Walsin-Tech-Corp-0603N271F500CT_C296058.html
footprint CAP-0603 (0603 (1608M) Capacitor)
pins: 1, 2

## 0603N271J500CT
designator C?  Capacitance: 270pF  (hidden comment: *)
Capacitor, Ceramic (MLCC), 270pF, ±5%, 50V, NP0, ±5%, SMD 0603; Manufacturer: Walsin Tech Corp; Manufacturer Part Number: 0603N271J500CT; Package Size: 0603; JLCPCB Basic Part: No; JLCPCB Part Number: C123546; Supplier 1: LCSC; Category: Capacitors - MLCC; Supplier Part Number 1: C123546; Tolerance: ±5%; Voltage Rating: 50V; Temperature Coefficient: NP0; RoHS: Yes; ComponentLink1Description: Datasheet; ComponentLink1URL: https://wmsc.lcsc.com/wmsc/upload/file/pdf/v2/lcsc/2304140030_Walsin-Tech-Corp-0603N271J500CT_C123546.pdf; ComponentLink2Description: JLCPCB Part URL; ComponentLink2URL: https://jlcpcb.com/partdetail/C123546; ComponentLink3Description: LCSC Part URL; ComponentLink3URL: https://lcsc.com/product-detail/Multilayer-Ceramic-Capacitors-MLCC---SMD-SMT_Walsin-Tech-Corp-Walsin-Tech-Corp-0603N271J500CT_C123546.html
footprint CAP-0603 (0603 (1608M) Capacitor)
pins: 1, 2

## 0603N272J500CT
designator C?  Capacitance: 2.7nF  (hidden comment: *)
Capacitor, Ceramic (MLCC), 2.7nF, ±5%, 50V, NP0, ±5%, SMD 0603; Manufacturer: Walsin Tech Corp; Manufacturer Part Number: 0603N272J500CT; Package Size: 0603; JLCPCB Basic Part: No; JLCPCB Part Number: C388043; Supplier 1: LCSC; Category: Capacitors - MLCC; Supplier Part Number 1: C388043; Tolerance: ±5%; Voltage Rating: 50V; Temperature Coefficient: NP0; RoHS: Yes; ComponentLink1Description: Datasheet; ComponentLink1URL: https://wmsc.lcsc.com/wmsc/upload/file/pdf/v2/lcsc/2304140030_Walsin-Tech-Corp-0603N272J500CT_C388043.pdf; ComponentLink2Description: JLCPCB Part URL; ComponentLink2URL: https://jlcpcb.com/partdetail/C388043; ComponentLink3Description: LCSC Part URL; ComponentLink3URL: https://lcsc.com/product-detail/Multilayer-Ceramic-Capacitors-MLCC---SMD-SMT_Walsin-Tech-Corp-Walsin-Tech-Corp-0603N272J500CT_C388043.html
footprint CAP-0603 (0603 (1608M) Capacitor)
pins: 1, 2

## 0603N300F500CT
designator C?  Capacitance: 30pF  (hidden comment: *)
Capacitor, Ceramic (MLCC), 30pF, ±1%, 50V, NP0, ±1%, SMD 0603; Manufacturer: Walsin Tech Corp; Manufacturer Part Number: 0603N300F500CT; Package Size: 0603; JLCPCB Basic Part: No; JLCPCB Part Number: C296060; Supplier 1: LCSC; Category: Capacitors - MLCC; Supplier Part Number 1: C296060; Tolerance: ±1%; Voltage Rating: 50V; Temperature Coefficient: NP0; RoHS: Yes; ComponentLink1Description: Datasheet; ComponentLink1URL: https://wmsc.lcsc.com/wmsc/upload/file/pdf/v2/lcsc/2304140030_Walsin-Tech-Corp-0603N300F500CT_C296060.pdf; ComponentLink2Description: JLCPCB Part URL; ComponentLink2URL: https://jlcpcb.com/partdetail/C296060; ComponentLink3Description: LCSC Part URL; ComponentLink3URL: https://lcsc.com/product-detail/Multilayer-Ceramic-Capacitors-MLCC---SMD-SMT_Walsin-Tech-Corp-Walsin-Tech-Corp-0603N300F500CT_C296060.html
footprint CAP-0603 (0603 (1608M) Capacitor)
pins: 1, 2

## 0603N300G500
designator C?  Capacitance: 30pF  (hidden comment: *)
Capacitor, Ceramic (MLCC), 30pF, ±2%, 50V, NP0, ±2%, SMD 0603; Manufacturer: Walsin Tech Corp; Manufacturer Part Number: 0603N300G500; Package Size: 0603; JLCPCB Basic Part: No; JLCPCB Part Number: C123554; Supplier 1: LCSC; Category: Capacitors - MLCC; Supplier Part Number 1: C123554; Tolerance: ±2%; Voltage Rating: 50V; Temperature Coefficient: NP0; RoHS: Yes; ComponentLink1Description: Datasheet; ComponentLink1URL: https://wmsc.lcsc.com/wmsc/upload/file/pdf/v2/lcsc/2304140030_Walsin-Tech-Corp-0603N300G500_C123554.pdf; ComponentLink2Description: JLCPCB Part URL; ComponentLink2URL: https://jlcpcb.com/partdetail/C123554; ComponentLink3Description: LCSC Part URL; ComponentLink3URL: https://lcsc.com/product-detail/Multilayer-Ceramic-Capacitors-MLCC---SMD-SMT_Walsin-Tech-Corp-Walsin-Tech-Corp-0603N300G500_C123554.html
footprint CAP-0603 (0603 (1608M) Capacitor)
pins: 1, 2

## 0603N300G500CT
designator C?  Capacitance: 30pF  (hidden comment: *)
Capacitor, Ceramic (MLCC), 30pF, 50V, NP0, SMD 0603; Manufacturer: Walsin Tech Corp; Manufacturer Part Number: 0603N300G500CT; Package Size: 0603; JLCPCB Basic Part: No; JLCPCB Part Number: C2962051; Supplier 1: LCSC; Category: Capacitors - MLCC; Supplier Part Number 1: C2962051; Voltage Rating: 50V; Temperature Coefficient: NP0; RoHS: Yes; ComponentLink1Description: Datasheet; ComponentLink1URL: https://wmsc.lcsc.com/wmsc/upload/file/pdf/v2/lcsc/2201181800_Walsin-Tech-Corp-0603N300G500CT_C2962051.pdf; ComponentLink2Description: JLCPCB Part URL; ComponentLink2URL: https://jlcpcb.com/partdetail/C2962051; ComponentLink3Description: LCSC Part URL; ComponentLink3URL: https://lcsc.com/product-detail/Multilayer-Ceramic-Capacitors-MLCC---SMD-SMT_Walsin-Tech-Corp-Walsin-Tech-Corp-0603N300G500CT_C2962051.html
footprint CAP-0603 (0603 (1608M) Capacitor)
pins: 1, 2

## 0603N300J500CT
designator C?  Capacitance: 30pF  (hidden comment: *)
Capacitor, Ceramic (MLCC), 30pF, ±5%, 50V, NP0, ±5%, SMD 0603; Manufacturer: Walsin Tech Corp; Manufacturer Part Number: 0603N300J500CT; Package Size: 0603; JLCPCB Basic Part: No; JLCPCB Part Number: C123555; Supplier 1: LCSC; Category: Capacitors - MLCC; Supplier Part Number 1: C123555; Tolerance: ±5%; Voltage Rating: 50V; Temperature Coefficient: NP0; RoHS: Yes; ComponentLink1Description: Datasheet; ComponentLink1URL: https://wmsc.lcsc.com/wmsc/upload/file/pdf/v2/lcsc/2304140030_Walsin-Tech-Corp-0603N300J500CT_C123555.pdf; ComponentLink2Description: JLCPCB Part URL; ComponentLink2URL: https://jlcpcb.com/partdetail/C123555; ComponentLink3Description: LCSC Part URL; ComponentLink3URL: https://lcsc.com/product-detail/Multilayer-Ceramic-Capacitors-MLCC---SMD-SMT_Walsin-Tech-Corp-Walsin-Tech-Corp-0603N300J500CT_C123555.html
footprint CAP-0603 (0603 (1608M) Capacitor)
pins: 1, 2

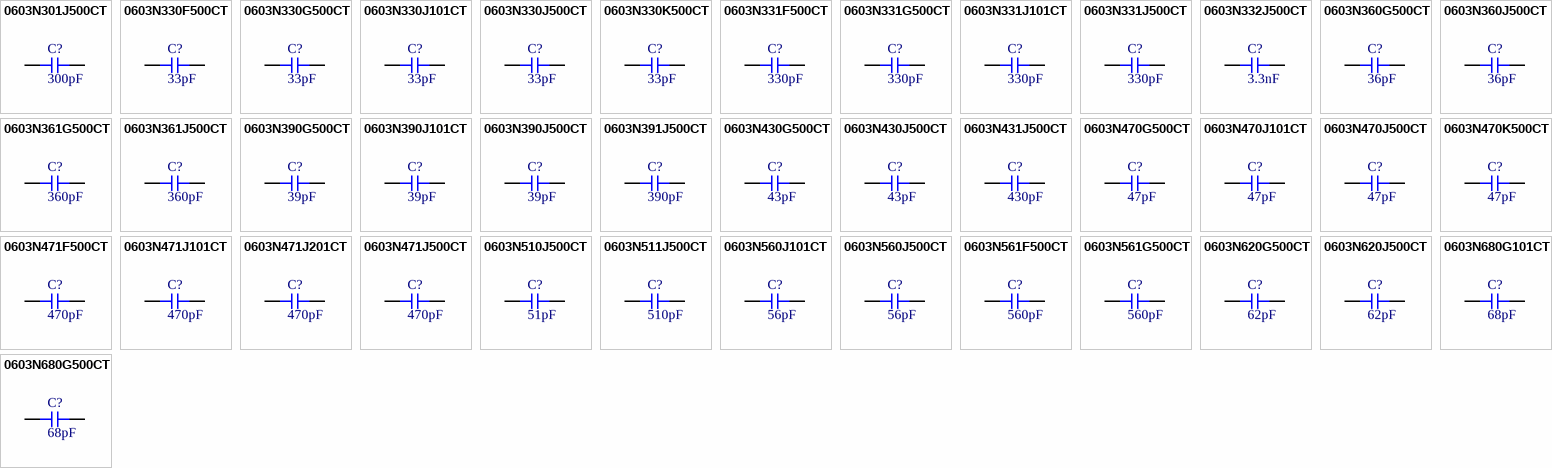
[diagram p18: symbols 0603N301J500CT to 0603N680G500CT]

## 0603N301J500CT
designator C?  Capacitance: 300pF  (hidden comment: *)
Capacitor, Ceramic (MLCC), 300pF, ±5%, 50V, NP0, ±5%, SMD 0603; Manufacturer: Walsin Tech Corp; Manufacturer Part Number: 0603N301J500CT; Package Size: 0603; JLCPCB Basic Part: No; JLCPCB Part Number: C296061; Supplier 1: LCSC; Category: Capacitors - MLCC; Supplier Part Number 1: C296061; Tolerance: ±5%; Voltage Rating: 50V; Temperature Coefficient: NP0; RoHS: Yes; ComponentLink1Description: Datasheet; ComponentLink1URL: https://wmsc.lcsc.com/wmsc/upload/file/pdf/v2/lcsc/2304140030_Walsin-Tech-Corp-0603N301J500CT_C296061.pdf; ComponentLink2Description: JLCPCB Part URL; ComponentLink2URL: https://jlcpcb.com/partdetail/C296061; ComponentLink3Description: LCSC Part URL; ComponentLink3URL: https://lcsc.com/product-detail/Multilayer-Ceramic-Capacitors-MLCC---SMD-SMT_Walsin-Tech-Corp-Walsin-Tech-Corp-0603N301J500CT_C296061.html
footprint CAP-0603 (0603 (1608M) Capacitor)
pins: 1, 2

## 0603N330F500CT
designator C?  Capacitance: 33pF  (hidden comment: *)
Capacitor, Ceramic (MLCC), 33pF, ±1%, 50V, NP0, ±1%, SMD 0603; Manufacturer: Walsin Tech Corp; Manufacturer Part Number: 0603N330F500CT; Package Size: 0603; JLCPCB Basic Part: No; JLCPCB Part Number: C296062; Supplier 1: LCSC; Category: Capacitors - MLCC; Supplier Part Number 1: C296062; Tolerance: ±1%; Voltage Rating: 50V; Temperature Coefficient: NP0; RoHS: Yes; ComponentLink1Description: Datasheet; ComponentLink1URL: https://wmsc.lcsc.com/wmsc/upload/file/pdf/v2/lcsc/2304140030_Walsin-Tech-Corp-0603N330F500CT_C296062.pdf; ComponentLink2Description: JLCPCB Part URL; ComponentLink2URL: https://jlcpcb.com/partdetail/C296062; ComponentLink3Description: LCSC Part URL; ComponentLink3URL: https://lcsc.com/product-detail/Multilayer-Ceramic-Capacitors-MLCC---SMD-SMT_Walsin-Tech-Corp-Walsin-Tech-Corp-0603N330F500CT_C296062.html
footprint CAP-0603 (0603 (1608M) Capacitor)
pins: 1, 2

## 0603N330G500CT
designator C?  Capacitance: 33pF  (hidden comment: *)
Capacitor, Ceramic (MLCC), 33pF, ±2%, 50V, NP0, ±2%, SMD 0603; Manufacturer: Walsin Tech Corp; Manufacturer Part Number: 0603N330G500CT; Package Size: 0603; JLCPCB Basic Part: No; JLCPCB Part Number: C388046; Supplier 1: LCSC; Category: Capacitors - MLCC; Supplier Part Number 1: C388046; Tolerance: ±2%; Voltage Rating: 50V; Temperature Coefficient: NP0; RoHS: Yes; ComponentLink1Description: Datasheet; ComponentLink1URL: https://wmsc.lcsc.com/wmsc/upload/file/pdf/v2/lcsc/2304140030_Walsin-Tech-Corp-0603N330G500CT_C388046.pdf; ComponentLink2Description: JLCPCB Part URL; ComponentLink2URL: https://jlcpcb.com/partdetail/C388046; ComponentLink3Description: LCSC Part URL; ComponentLink3URL: https://lcsc.com/product-detail/Multilayer-Ceramic-Capacitors-MLCC---SMD-SMT_Walsin-Tech-Corp-Walsin-Tech-Corp-0603N330G500CT_C388046.html
footprint CAP-0603 (0603 (1608M) Capacitor)
pins: 1, 2